# Altium footprint library my Library.PcbLib: 1247 footprints (part 63 of 78)
Each footprint in its own frame and in the unit in brackets; x right, y up, seen from the top. Pads: shape width x height; smd on the part's side, far side on the other; paste and mask are expansions set on the pad; w line width, h text height; cw(c..) or ccw(c..) is an arc to the next point about the centre after c.
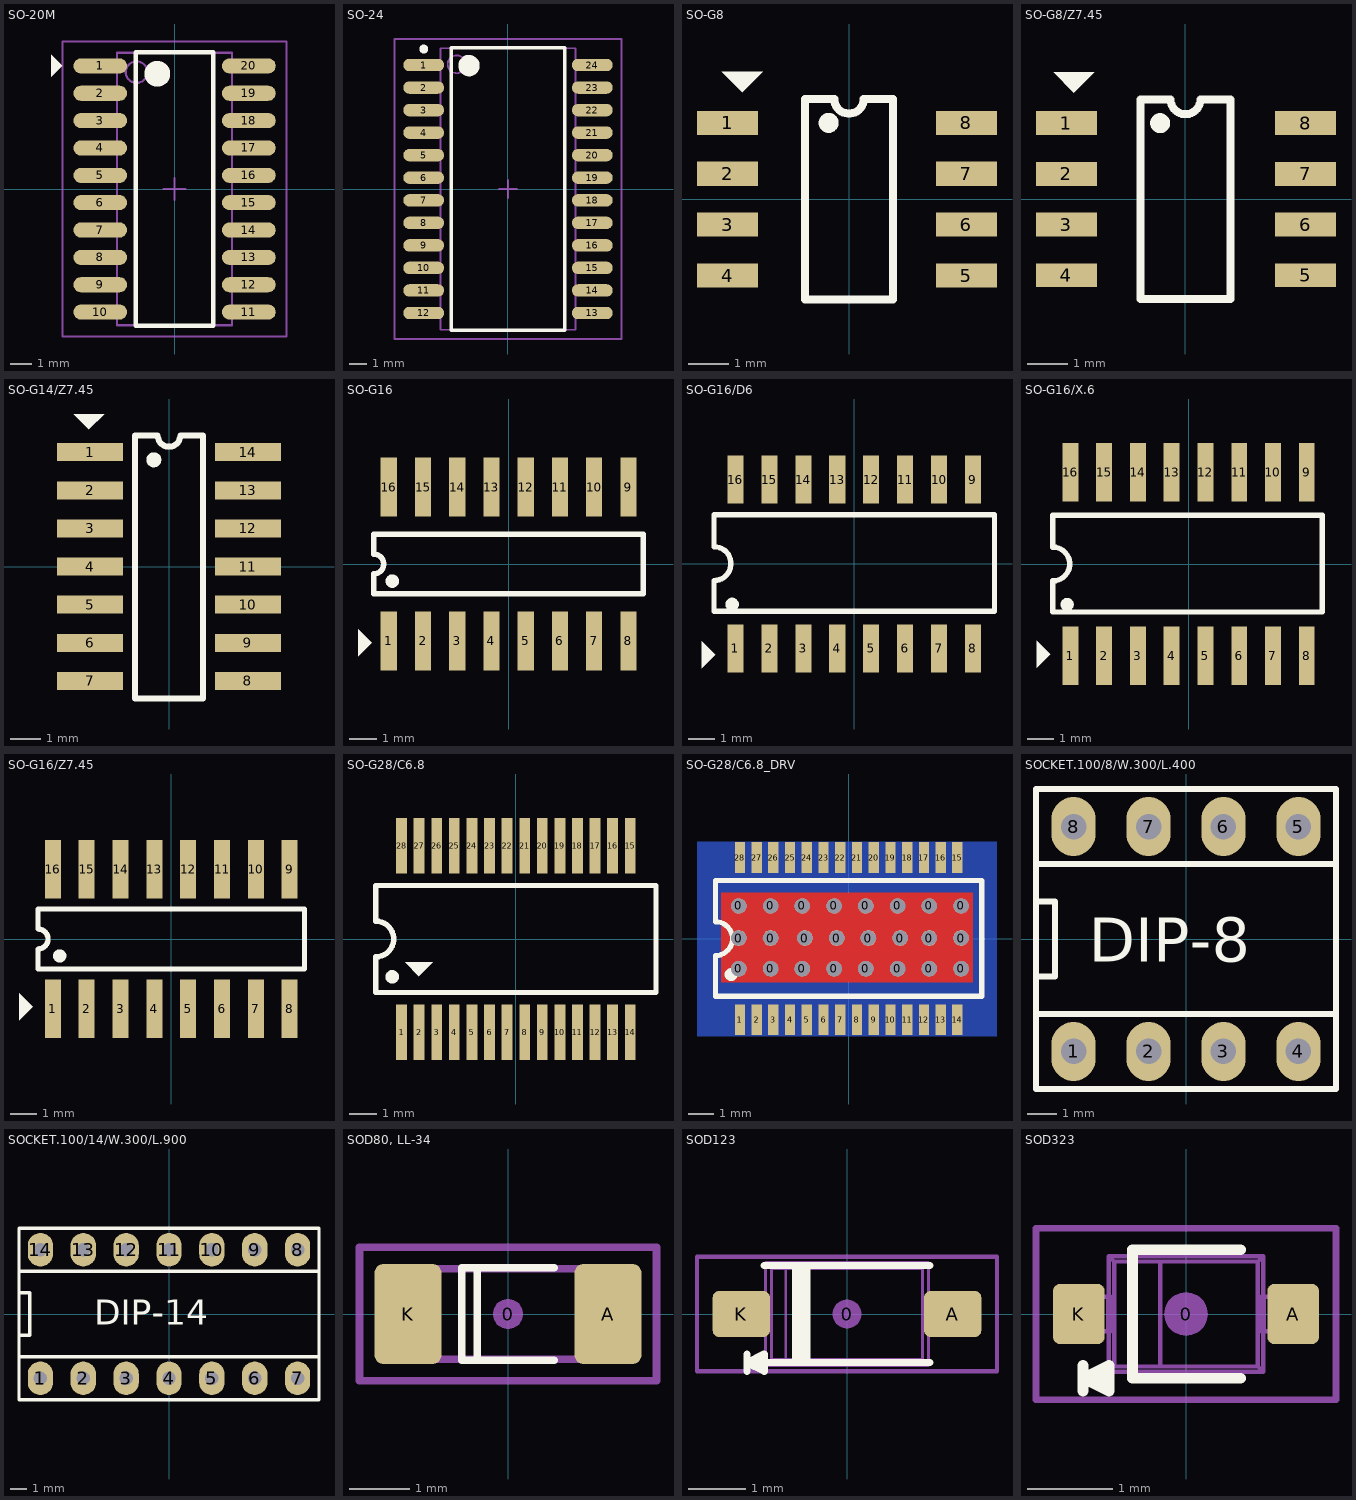
[diagram p62: the footprints below, top view; thin cyan lines are the x and y axes]

## SO-20M [mm] "SOP, 20-Leads, Body 12.6x5.3mm, Pitch 1.27mm, IPC Low Density"
height 1.96
pads (20):
  oval 2.5x0.7 smd: 1(-3.45,5.715) 2(-3.45,4.445) 3(-3.45,3.175) 4(-3.45,1.905) 5(-3.45,0.635) 6(-3.45,-0.635) 7(-3.45,-1.905) 8(-3.45,-3.175) 9(-3.45,-4.445) 10(-3.45,-5.715) 11(3.45,-5.715) 12(3.45,-4.445) 13(3.45,-3.175) 14(3.45,-1.905) 15(3.45,-0.635) 16(3.45,0.635) 17(3.45,1.905) 18(3.45,3.175) 19(3.45,4.445) 20(3.45,5.715)
Top Overlay:
  circle w0.6: c-0.8,5.35 r0.3
  region: -5.715,5.207 -5.207,5.715 -5.715,6.223
  lines w0.2: -1.8,-6.35 -1.8,6.35 1.8,6.35 1.8,-6.35 -1.8,-6.35
Mechanical 13:
  circle w0.1: c-1.765,5.425 r0.5
  lines w0.1: -2.665,-6.325 -2.665,6.325 2.665,6.325 2.665,-6.325 -2.665,-6.325
Mechanical 15:
  lines w0.1: -0.5,0 0.5,0 ; 0,-0.5 0,0.5 ; -5.2,-6.85 -5.2,6.85 5.2,6.85 5.2,-6.85 -5.2,-6.85
3D body: height 1.96, standoff 0, extent -2.665,-6.325 2.665,6.325

## SO-24 [mm] "SOIC, 24-Leads, Body 15.4x7.5mm, Pitch 1.27mm, IPC Low Density"
height 2.67
pads (24):
  oval 2.3x0.7 smd: 1(-4.75,6.985) 2(-4.75,5.715) 3(-4.75,4.445) 4(-4.75,3.175) 5(-4.75,1.905) 6(-4.75,0.635) 7(-4.75,-0.635) 8(-4.75,-1.905) 9(-4.75,-3.175) 10(-4.75,-4.445) 11(-4.75,-5.715) 12(-4.75,-6.985) 13(4.75,-6.985) 14(4.75,-5.715) 15(4.75,-4.445) 16(4.75,-3.175) 17(4.75,-1.905) 18(4.75,-0.635) 19(4.75,0.635) 20(4.75,1.905) 21(4.75,3.175) 22(4.75,4.445) 23(4.75,5.715) 24(4.75,6.985)
Top Overlay:
  circle w0.25: c-4.75,7.885 r0.125
  circle w0.6: c-2.2,6.95 r0.3
  lines w0.2: -3.2,-7.95 -3.2,7.95 3.2,7.95 3.2,-7.95 -3.2,-7.95
Mechanical 13:
  circle w0.1: c-2.9,7.025 r0.5
  lines w0.1: -3.8,-7.925 -3.8,7.925 3.8,7.925 3.8,-7.925 -3.8,-7.925
Mechanical 15:
  lines w0.1: -0.5,0 0.5,0 ; 0,-0.5 0,0.5 ; -6.4,-8.45 -6.4,8.45 6.4,8.45 6.4,-8.45 -6.4,-8.45
3D body: height 2.67, standoff 0, extent -3.8,-7.925 3.8,7.925

## SO-G8 [mm] "Small Outline; 8 Leads; Body Width 3.9 mm; Pitch 1.27 mm"
height 1.75
pads (8):
  rect 1.524x0.6 smd: 1(-3.032,1.905) 2(-3.032,0.635) 3(-3.032,-0.635) 4(-3.032,-1.905) 5(2.93,-1.905) 6(2.93,-0.635) 7(2.93,0.635) 8(2.93,1.905)
Top Overlay:
  circle w0.25: c-0.508,1.903 r0.125
  region: -3.175,3.175 -2.667,2.667 -2.159,3.175
  lines w0.2: -1.1,-2.5 -1.1,2.5 -0.367,2.5 ccw(c0,2.5) 0.367,2.5 1.1,2.5 1.1,-2.5 -1.1,-2.5
3D body "User Library-SOIC.STEP": height 1.7, standoff 0, extent -3.15,-2.413 3.048,2.413

## SO-G8/Z7.45 [mm] "Small Outline; 8 Leads; Body Width 3.9 mm; Pitch 1.27 mm"
height 1.75
pads (8):
  rect 1.524x0.6 smd: 1(-2.981,1.905) 2(-2.981,0.635) 3(-2.981,-0.635) 4(-2.981,-1.905) 5(3.006,-1.905) 6(3.006,-0.635) 7(3.006,0.635) 8(3.006,1.905)
Top Overlay:
  circle w0.25: c-0.635,1.903 r0.125
  region: -3.302,3.175 -2.794,2.667 -2.286,3.175
  lines w0.2: -1.125,-2.5 1.125,-2.5 1.125,2.5 0.375,2.5 cw(c0,2.5) -0.375,2.5 -1.125,2.5 -1.125,-2.5
3D body "User Library-SOIC.STEP": height 1.7, standoff 0, extent -3.048,-2.413 3.15,2.413

## SO-G14/Z7.45 [mm] "Small Outline; 14 Leads; Body Width 3.9 mm; Pitch 1.27 mm"
height 1.75
pads (14):
  rect 2.2x0.6 smd: 1(-2.625,3.81) 2(-2.625,2.54) 3(-2.625,1.27) 4(-2.625,0) 5(-2.625,-1.27) 6(-2.625,-2.54) 7(-2.625,-3.81) 8(2.625,-3.81) 9(2.625,-2.54) 10(2.625,-1.27) 11(2.625,0) 12(2.625,1.27) 13(2.625,2.54) 14(2.625,3.81)
Top Overlay:
  circle w0.25: c-0.508,3.554 r0.125
  region: -3.175,5.08 -2.667,4.572 -2.159,5.08
  lines w0.2: -1.125,-4.394 1.125,-4.394 1.125,4.365 0.375,4.365 cw(c0,4.365) -0.375,4.365 -1.125,4.365 -1.125,-4.394
3D body "User Library-so14-1.STEP": height 1.7, standoff 0, extent -2.972,-4.38 3.028,4.42

## SO-G16 [mm] "Small Outline; 16 Leads; Body Width 3.9 mm; Pitch 1.27 mm"
height 1.75
pads (16):
  rect 0.6x2.2 smd: 1(-4.445,-2.854) 2(-3.175,-2.854) 3(-1.905,-2.854) 4(-0.635,-2.854) 5(0.635,-2.854) 6(1.905,-2.854) 7(3.175,-2.854) 8(4.445,-2.854) 9(4.445,2.854) 10(3.175,2.854) 11(1.905,2.854) 12(0.635,2.854) 13(-0.635,2.854) 14(-1.905,2.854) 15(-3.175,2.854) 16(-4.445,2.854)
Top Overlay:
  circle w0.25: c-4.316,-0.635 r0.125
  region: -5.588,-3.429 -5.08,-2.921 -5.588,-2.413
  lines w0.2: -5,-1.1 -5,-0.367 ccw(c-5,0) -5,0.367 -5,1.1 5,1.1 5,-1.1 -5,-1.1

## SO-G16/D6 [mm] "Small Outline; 16 Leads; Body Width 5.3 mm; Pitch 1.27 mm"
height 2
pads (16):
  rect 0.6x1.8 smd: 1(-4.445,-3.168) 2(-3.175,-3.168) 3(-1.905,-3.168) 4(-0.635,-3.168) 5(0.635,-3.168) 6(1.905,-3.168) 7(3.175,-3.168) 8(4.445,-3.168) 9(4.445,3.143) 10(3.175,3.143) 11(1.905,3.143) 12(0.635,3.143) 13(-0.635,3.143) 14(-1.905,3.143) 15(-3.175,3.143) 16(-4.445,3.143)
Top Overlay:
  circle w0.25: c-4.57,-1.524 r0.125
  region: -5.715,-3.912 -5.207,-3.404 -5.715,-2.896
  lines w0.2: -5.25,-1.778 -5.25,-0.635 ccw(c-5.25,0) -5.25,0.635 -5.25,1.829 5.25,1.829 5.25,-1.778 -5.25,-1.778

## SO-G16/X.6 [mm] "Small Outline; 16 Leads; Body Width 5.3 mm; Pitch 1.27 mm"
height 2
pads (16):
  rect 0.6x2.2 smd: 1(-4.445,-3.448) 2(-3.175,-3.448) 3(-1.905,-3.448) 4(-0.635,-3.448) 5(0.635,-3.448) 6(1.905,-3.448) 7(3.175,-3.448) 8(4.445,-3.448) 9(4.445,3.448) 10(3.175,3.448) 11(1.905,3.448) 12(0.635,3.448) 13(-0.635,3.448) 14(-1.905,3.448) 15(-3.175,3.448) 16(-4.445,3.448)
Top Overlay:
  circle w0.25: c-4.57,-1.524 r0.125
  region: -5.715,-3.912 -5.207,-3.404 -5.715,-2.896
  lines w0.2: -5.105,0.635 cw(c-5.105,0) -5.105,-0.635 -5.105,-1.803 5.029,-1.803 5.029,1.829 -5.105,1.829 -5.105,0.686

## SO-G16/Z7.45 [mm] "Small Outline; 16 Leads; Body Width 3.9 mm; Pitch 1.27 mm"
height 1.75
pads (16):
  rect 0.6x2.2 smd: 1(-4.445,-2.625) 2(-3.175,-2.625) 3(-1.905,-2.625) 4(-0.635,-2.625) 5(0.635,-2.625) 6(1.905,-2.625) 7(3.175,-2.625) 8(4.445,-2.625) 9(4.445,2.625) 10(3.175,2.625) 11(1.905,2.625) 12(0.635,2.625) 13(-0.635,2.625) 14(-1.905,2.625) 15(-3.175,2.625) 16(-4.445,2.625)
Top Overlay:
  circle w0.25: c-4.189,-0.635 r0.125
  region: -5.715,-3.048 -5.207,-2.54 -5.715,-2.032
  lines w0.2: -5,-1.125 -5,-0.375 ccw(c-5,0) -5,0.375 -5,1.125 5,1.125 5,-1.125 -5,-1.125

## SO-G28/C6.8 [mm] "SSOP, Plastic; 28 Leads; Body Width 5.3 mm; Pitch 0.65 mm"
height 1.99
pads (28):
  rect 0.4x2.05 smd: 1(-4.225,-3.451) 2(-3.575,-3.451) 3(-2.925,-3.451) 4(-2.275,-3.451) 5(-1.625,-3.451) 6(-0.975,-3.451) 7(-0.325,-3.451) 8(0.325,-3.451) 9(0.975,-3.451) 10(1.625,-3.451) 11(2.275,-3.451) 12(2.925,-3.451) 13(3.575,-3.451) 14(4.225,-3.451) 15(4.225,3.451) 16(3.575,3.451) 17(2.925,3.451) 18(2.275,3.451) 19(1.625,3.451) 20(0.975,3.451) 21(0.325,3.451) 22(-0.325,3.451) 23(-0.975,3.451) 24(-1.625,3.451) 25(-2.275,3.451) 26(-2.925,3.451) 27(-3.575,3.451) 28(-4.225,3.451)
Top Overlay:
  circle w0.25: c-4.57,-1.397 r0.125
  region: -4.089,-0.864 -3.581,-1.372 -3.073,-0.864
  lines w0.2: -5.175,-1.975 5.175,-1.975 5.175,1.975 -5.175,1.975 -5.175,0.658 cw(c-5.175,0) -5.175,-0.658 -5.175,-1.975
3D body: height 1.14, standoff 1.02, extent -4.804,-1.748 -4.296,-1.24
3D body: height 1.27, standoff 1.02, extent 2.794,-0.33 3.708,1.067
3D body: height 1.27, standoff 1.02, extent 1.524,-0.305 2.54,1.092
3D body: height 1.27, standoff 1.02, extent 0.254,-0.305 1.168,1.092
3D body: height 1.27, standoff 1.02, extent -0.914,-0.305 -0.102,1.092
3D body: height 1.27, standoff 1.02, extent -3.175,-0.305 -2.362,1.092
3D body: height 1.27, standoff 1.02, extent -2.032,-0.305 -1.245,1.092
3D body: height 0.25, standoff 0, extent -3.759,2.032 -3.378,3.429
3D body: height 0.25, standoff 0, extent -4.42,2.032 -4.039,3.429
3D body: height 0.25, standoff 0, extent -3.124,2.007 -2.743,3.404
3D body: height 0.25, standoff 0, extent -2.464,2.007 -2.083,3.404
3D body: height 0.25, standoff 0, extent -1.829,2.007 -1.448,3.404
3D body: height 0.25, standoff 0, extent -1.168,2.007 -0.787,3.404
3D body: height 0.25, standoff 0, extent -0.508,2.007 -0.127,3.404
3D body: height 0.25, standoff 0, extent 0.152,2.007 0.533,3.404
3D body: height 0.25, standoff 0, extent 0.762,2.007 1.143,3.404
3D body: height 0.25, standoff 0, extent 1.422,2.007 1.803,3.404
3D body: height 0.25, standoff 0, extent 2.083,2.007 2.464,3.404
3D body: height 0.25, standoff 0, extent 2.743,2.007 3.124,3.404
3D body: height 0.25, standoff 0, extent 3.378,2.007 3.759,3.404
3D body: height 0.25, standoff 0, extent 4.039,2.007 4.42,3.404
3D body: height 0.25, standoff 0, extent 4.039,-3.454 4.42,-2.057
3D body: height 0.25, standoff 0, extent 3.378,-3.454 3.759,-2.057
3D body: height 0.25, standoff 0, extent 2.743,-3.454 3.124,-2.057
3D body: height 0.25, standoff 0, extent 2.083,-3.454 2.464,-2.057
3D body: height 0.25, standoff 0, extent 1.422,-3.454 1.803,-2.057
3D body: height 0.25, standoff 0, extent 0.762,-3.454 1.143,-2.057
3D body: height 0.25, standoff 0, extent 0.152,-3.454 0.533,-2.057
3D body: height 0.25, standoff 0, extent -0.508,-3.454 -0.127,-2.057
3D body: height 0.25, standoff 0, extent -1.168,-3.454 -0.787,-2.057
3D body: height 0.25, standoff 0, extent -1.829,-3.454 -1.448,-2.057
3D body: height 0.25, standoff 0, extent -2.464,-3.454 -2.083,-2.057
3D body: height 0.25, standoff 0, extent -3.124,-3.454 -2.743,-2.057
3D body: height 1.02, standoff 0.23, extent -5.156,-1.981 5.258,2.083
3D body: height 0.25, standoff 0, extent -4.42,-3.429 -4.039,-2.032
3D body: height 0.25, standoff 0, extent -3.759,-3.429 -3.378,-2.032

## SO-G28/C6.8_DRV [mm] "SSOP, Plastic; 28 Leads; Body Width 5.3 mm; Pitch 0.65 mm"
height 1.99
pads (52):
  round 0.6 hole 0.6 paste+2.54 mask+0: 0(-4.267,-1.168) 0(-4.267,1.27) 0(-3.033,-1.168) 0(-3.033,1.27) 0(-1.8,-1.168) 0(-1.8,1.27) 0(-0.566,-1.168) 0(-0.566,1.27) 0(0.668,-1.168) 0(0.668,1.27) 0(1.901,-1.168) 0(1.901,1.27) 0(3.135,-1.168) 0(3.135,1.27) 0(4.369,-1.168) 0(4.369,1.27)
  round 0.61 hole 0.6 paste+2.54 mask+0: 0(-4.267,0.025) 0(-3.033,0.025) 0(-1.698,0.025) 0(-0.464,0.025) 0(0.769,0.025) 0(2.003,0.025) 0(3.135,0.025) 0(4.369,0.025)
  rect 0.4x1.2 smd: 1(-4.225,-3.151) 2(-3.575,-3.151) 3(-2.925,-3.151) 4(-2.275,-3.151) 5(-1.625,-3.151) 6(-0.975,-3.151) 7(-0.325,-3.151) 8(0.325,-3.151) 9(0.975,-3.151) 10(1.625,-3.151) 11(2.275,-3.151) 12(2.925,-3.151) 13(3.575,-3.151) 14(4.225,-3.151) 15(4.225,3.151) 16(3.575,3.151) 17(2.925,3.151) 18(2.275,3.151) 19(1.625,3.151) 20(0.975,3.151) 21(0.325,3.151) 22(-0.325,3.151) 23(-0.975,3.151) 24(-1.625,3.151) 25(-2.275,3.151) 26(-2.925,3.151) 27(-3.575,3.151) 28(-4.225,3.151)
Top Layer:
  rectangle: -4.953,-1.702 4.826,1.803
Bottom Layer:
  rectangle: -5.893,-3.81 5.766,3.785
Top Overlay:
  circle w0.25: c-4.57,-1.397 r0.125
  lines w0.2: -5.175,-2.235 5.175,-2.235 5.175,2.261 -5.175,2.261 -5.175,0.658 cw(c-5.175,0) -5.175,-0.658 -5.175,-2.235
Top Solder:
  rectangle: -4.115,-1.575 4.267,1.651
Bottom Solder:
  rectangle: -5.893,-3.81 5.766,3.785
3D body: height 1.14, standoff 1.02, extent -4.804,-1.748 -4.296,-1.24
3D body: height 0.25, standoff 0, extent -3.759,2.032 -3.378,3.429
3D body: height 0.25, standoff 0, extent -4.42,2.032 -4.039,3.429
3D body: height 0.25, standoff 0, extent -3.124,2.007 -2.743,3.404
3D body: height 0.25, standoff 0, extent -2.464,2.007 -2.083,3.404
3D body: height 0.25, standoff 0, extent -1.829,2.007 -1.448,3.404
3D body: height 0.25, standoff 0, extent -1.168,2.007 -0.787,3.404
3D body: height 0.25, standoff 0, extent -0.508,2.007 -0.127,3.404
3D body: height 0.25, standoff 0, extent 0.152,2.007 0.533,3.404
3D body: height 0.25, standoff 0, extent 0.762,2.007 1.143,3.404
3D body: height 0.25, standoff 0, extent 1.422,2.007 1.803,3.404
3D body: height 0.25, standoff 0, extent 2.083,2.007 2.464,3.404
3D body: height 0.25, standoff 0, extent 2.743,2.007 3.124,3.404
3D body: height 0.25, standoff 0, extent 3.378,2.007 3.759,3.404
3D body: height 0.25, standoff 0, extent 4.039,2.007 4.42,3.404
3D body: height 1.02, standoff 0.23, extent -5.156,-1.981 5.258,2.083
3D body: height 0.25, standoff 0, extent 4.039,-3.454 4.42,-2.057
3D body: height 0.25, standoff 0, extent 3.378,-3.454 3.759,-2.057
3D body: height 0.25, standoff 0, extent 2.743,-3.454 3.124,-2.057
3D body: height 0.25, standoff 0, extent 2.083,-3.454 2.464,-2.057
3D body: height 0.25, standoff 0, extent 1.422,-3.454 1.803,-2.057
3D body: height 0.25, standoff 0, extent 0.762,-3.454 1.143,-2.057
3D body: height 0.25, standoff 0, extent 0.152,-3.454 0.533,-2.057
3D body: height 0.25, standoff 0, extent -0.508,-3.454 -0.127,-2.057
3D body: height 0.25, standoff 0, extent -1.168,-3.454 -0.787,-2.057
3D body: height 0.25, standoff 0, extent -1.829,-3.454 -1.448,-2.057
3D body: height 0.25, standoff 0, extent -2.464,-3.454 -2.083,-2.057
3D body: height 0.25, standoff 0, extent -3.124,-3.454 -2.743,-2.057
3D body: height 0.25, standoff 0, extent -4.42,-3.429 -4.039,-2.032
3D body: height 0.25, standoff 0, extent -3.759,-3.429 -3.378,-2.032

## SOCKET.100/8/W.300/L.400 [mm]
pads (8):
  oval 1.5x2 hole 0.864: 1(-3.81,-3.81) 2(-1.27,-3.81) 3(1.27,-3.81) 4(3.81,-3.81) 5(3.81,3.81) 6(1.27,3.81) 7(-1.27,3.81) 8(-3.81,3.81)
Top Overlay:
  lines w0.203: -5.08,-2.54 5.08,-2.54 ; -5.08,-2.54 -5.08,2.54 ; -5.08,-2.54 5.08,-2.54 ; -5.08,-2.54 -5.08,2.54 ; -5.08,-2.54 -5.08,-5.08 5.08,-5.08 5.08,2.54 ; -5.08,-2.54 -5.08,-1.27 ; -5.08,-1.27 -4.445,-1.27 ; -5.08,-1.27 -4.445,-1.27 ; -5.08,-1.27 -5.08,1.27 ; -5.08,1.27 -4.445,1.27 ; -5.08,1.27 -4.445,1.27 ; -5.08,1.27 -5.08,5.08 5.08,5.08 5.08,2.54 ; -5.08,2.54 5.08,2.54 ; -5.08,2.54 5.08,2.54 ; -4.445,-1.27 -4.445,1.27 ; -4.445,-1.27 -4.445,1.27 ; 5.08,-2.54 5.08,2.54 ; 5.08,-2.54 5.08,2.54
  text "DIP-8" at -3.302,-0.762 h1.5
3D body: height 4.5, standoff -3.09, extent -5.08,-5.08 5.08,5.08

## SOCKET.100/14/W.300/L.900 [mm]
height 5.59
pads (14):
  oval 1.5x2 hole 0.8: 1(-7.62,-3.81) 2(-5.08,-3.81) 3(-2.54,-3.81) 4(0,-3.81) 5(2.54,-3.81) 6(5.08,-3.81) 7(7.62,-3.81) 8(7.62,3.81) 9(5.08,3.81) 10(2.54,3.81) 11(0,3.81) 12(-2.54,3.81) 13(-5.08,3.81) 14(-7.62,3.81)
Top Overlay:
  lines w0.203: -8.89,-2.54 -8.89,-1.27 ; -8.89,-2.54 -8.89,-1.27 ; -8.89,-2.54 8.89,-2.54 ; -8.89,-2.54 8.89,-2.54 ; -8.89,-1.27 -8.255,-1.27 ; -8.89,-1.27 -8.89,1.27 ; -8.89,-1.27 -8.255,-1.27 ; -8.89,-1.27 -8.89,1.27 ; -8.89,1.27 -8.255,1.27 ; -8.89,1.27 -8.89,2.54 ; -8.89,1.27 -8.255,1.27 ; -8.89,1.27 -8.89,2.54 ; -8.89,2.54 8.89,2.54 ; -8.89,2.54 8.89,2.54 ; -8.255,-1.27 -8.255,1.27 ; -8.255,-1.27 -8.255,1.27 ; 8.89,-2.54 8.89,2.54 ; -8.89,-5.08 8.89,-5.08 8.89,5.08 -8.89,5.08 -8.89,-5.08
  text "DIP-14" at -4.445,-0.635 h1.5
3D body: height 4.5, standoff -3.09, extent -8.89,-5.08 8.89,5.08

## SOD80, LL-34 [mm] "Diode, MiniMELF"
height 1.6
pads (3):
  round 0.5 on Mech15: 0(0,0)
  rrect25% 1.1x1.65 smd: A(1.65,0) K(-1.65,0)
Top Overlay:
  lines w0.127: -0.508,-0.762 -0.508,0.762 ; 0.762,-0.762 -0.762,-0.762 -0.762,0.762 0.762,0.762
Mechanical 13:
  lines w0.127: -1.8,-0.747 -1.8,0.747 1.8,0.747 1.8,-0.747 -1.8,-0.747
Mechanical 15:
  lines w0.127: -2.45,-1.1 -2.45,1.1 2.45,1.1 2.45,-1.1 -2.45,-1.1
3D body "SOD80.stp": height 1.47, standoff -0.01, extent -1.8,-0.747 1.8,0.747

## SOD123 [mm] "SOD-123; 2 Leads; Body 2.7 x 1.6 mm, (LxW)"
height 1.35
pads (3):
  round 0.508 on Mech15: 0(0,0)
  rrect25% 1x0.8 smd: A(1.85,0) K(-1.85,0)
Top Overlay:
  lines w0.127: -1.75,-1 -1.75,-0.7 ; -1.45,0.85 1.45,0.85 ; -0.9,-0.85 -0.9,0.85 ; -0.8,-0.85 -0.8,0.85 ; -0.7,-0.85 -0.7,0.85 ; 1.448,-0.85 -1.45,-0.85 -1.75,-0.85 ; -1.75,-0.85 -1.45,-1 -1.45,-0.7 -1.75,-0.85
Mechanical 13:
  lines w0.05: -1.766,-0.308 -1.766,0.308 ; -1.707,-0.308 -1.707,0.308 ; -1.517,-0.308 -1.517,0.308 ; -1.425,-0.308 -1.95,-0.308 -1.95,0.308 -1.425,0.308 ; 1.425,-0.308 1.95,-0.308 1.95,0.308 1.425,0.308 ; 1.517,-0.308 1.517,0.308 ; 1.707,-0.308 1.707,0.308 ; 1.766,-0.308 1.766,0.308 ; -1.425,-0.9 1.425,-0.9 ; -1.425,-0.9 -1.323,-0.798 ; -1.425,-0.9 -1.425,0.9 ; -1.425,0.9 -1.323,0.798 ; -1.425,0.9 1.425,0.9 ; -1.323,-0.798 -1.072,-0.798 ; -1.323,-0.798 -1.323,0.798 ; -1.323,0.798 -1.072,0.798 ; -1.072,-0.798 1.322,-0.797 ; -1.072,-0.798 -1.072,0.798 ; -1.072,0.798 1.322,0.797 ; 1.322,-0.797 1.322,0.797 ; 1.322,-0.797 1.425,-0.9 ; 1.322,0.797 1.425,0.9 ; 1.425,-0.9 1.425,0.9
Mechanical 15:
  lines w0.076: -2.625,-1 2.625,-1 2.625,1 -2.625,1 -2.625,-1
3D body "SOD123.STEP": height 1.18, standoff 0, extent -1.95,-0.9 1.95,0.9

## SOD323 [mm] "SOD-323; 2 Leads; Body 1.8 x 1.35 mm, (LxW)"
height 1.15
pads (3):
  round 0.508 on Mech15: 0(0,0)
  rrect25% 0.6x0.7 smd: A(1.25,0) K(-1.25,0)
Top Overlay:
  lines w0.127: -1.2,-0.9 -1.2,-0.6 ; -0.9,-0.75 -1.2,-0.75 ; 0.635,-0.75 -0.625,-0.75 -0.625,0.75 0.635,0.75 ; -1.2,-0.75 -0.9,-0.6 -0.9,-0.9 -1.2,-0.75
Mechanical 13:
  lines w0.05: -1.157,-0.2 -1.157,0.2 ; -1.11,-0.2 -1.11,0.2 ; -0.91,-0.2 -0.91,0.2 ; -0.9,-0.2 -0.9,-0.675 ; -0.9,0.2 -0.9,0.675 ; 0.9,-0.2 0.9,-0.675 ; 0.9,0.2 0.9,0.675 ; 0.91,-0.2 0.91,0.2 ; 1.11,-0.2 1.11,0.2 ; 1.157,-0.2 1.157,0.2 ; -0.9,-0.675 0.9,-0.675 ; -0.9,-0.675 -0.838,-0.613 ; -0.9,0.675 -0.838,0.613 ; -0.9,0.675 0.9,0.675 ; -0.838,-0.613 -0.3,-0.613 ; -0.838,-0.613 -0.838,0.613 ; -0.838,0.613 -0.3,0.613 ; -0.3,-0.613 0.838,-0.613 ; -0.3,-0.613 -0.3,0.613 ; -0.3,0.613 0.838,0.613 ; 0.838,-0.613 0.9,-0.675 ; 0.838,-0.613 0.838,0.613 ; 0.838,0.613 0.9,0.675 ; -1.3,-0.2 -0.879,-0.2 -0.879,0.2 -1.3,0.2 -1.3,-0.2 ; 0.879,-0.2 0.879,0.2 1.3,0.2 1.3,-0.2 0.879,-0.2
Mechanical 15:
  lines w0.076: -1.75,-1 1.75,-1 1.75,1 -1.75,1 -1.75,-1
3D body "SOD323.STEP": height 1.1, standoff 0, extent -1.3,-0.675 1.3,0.675